# Altium footprint library WR-TBL_Pluggable PCB Header_3.50mm.PcbLib: 50 footprints (part 4 of 4)
Each footprint in its own frame and in the unit in brackets; x right, y up, seen from the top. Pads: shape width x height; smd on the part's side, far side on the other; paste and mask are expansions set on the pad; w line width, h text height; cw(c..) or ccw(c..) is an arc to the next point about the centre after c.
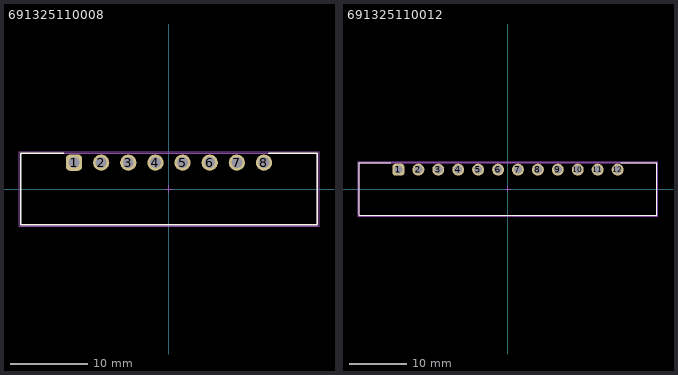
[diagram p3: the footprints below, top view; thin cyan lines are the x and y axes]

## 691325110008 [mm] "Horizontal PCB Header with Flanges, pitch 3.5mm, 08p"
height 7.2
pads (8):
  rrect50% 2.1x2.1 hole 1.4: 1(-12.25,3.4)
  round 2.1 hole 1.4: 2(-8.75,3.4) 3(-5.25,3.4) 4(-1.75,3.4) 5(1.75,3.4) 6(5.25,3.4) 7(8.75,3.4) 8(12.25,3.4)
Top Overlay:
  lines w0.2: -13.6,4.6 -19.15,4.6 -19.15,-4.6 19.15,-4.6 19.15,4.6 12.85,4.6
Top Designator:
  text ".Designator" at -7.498,-0.5 h1.5
Top Component Outline:
  lines w0.1: -19.15,-4.6 19.15,-4.6 19.15,4.6 -19.15,4.6 -19.15,-4.6
Top 3D Body:
  lines w0.1: -19.15,-4.6 -19.15,4.6 19.15,4.6 19.15,-4.6 -19.15,-4.6
Top Courtyard:
  lines w0.05: -19.35,-4.8 -19.35,4.8 19.35,4.8 19.35,-4.8 -19.35,-4.8
Top Component Center:
  lines w0.05: -0.5,0 0.5,0 ; 0,-0.5 0,0.5
3D body "691325110008.stp": height 7.3, standoff -3.4, extent -19.15,-4.6 19.15,4.6

## 691325110012 [mm] "Horizontal PCB Header with Flanges, pitch 3.5mm, 12p"
height 7.2
pads (12):
  rrect50% 2.1x2.1 hole 1.4: 1(-19.25,3.4)
  round 2.1 hole 1.4: 2(-15.75,3.4) 3(-12.25,3.4) 4(-8.75,3.4) 5(-5.25,3.4) 6(-1.75,3.4) 7(1.75,3.4) 8(5.25,3.4) 9(8.75,3.4) 10(12.25,3.4) 11(15.75,3.4) 12(19.25,3.4)
Top Overlay:
  lines w0.2: -20.6,4.6 -26.15,4.6 -26.15,-4.6 26.15,-4.6 26.15,4.6 19.85,4.6
Top Designator:
  text ".Designator" at -7.498,-0.5 h1.5
Top Component Outline:
  lines w0.1: -26.15,-4.6 26.15,-4.6 26.15,4.6 -26.15,4.6 -26.15,-4.6
Top 3D Body:
  lines w0.1: -26.15,-4.6 -26.15,4.6 26.15,4.6 26.15,-4.6 -26.15,-4.6
Top Courtyard:
  lines w0.05: -26.35,-4.8 -26.35,4.8 26.35,4.8 26.35,-4.8 -26.35,-4.8
Top Component Center:
  lines w0.05: -0.5,0 0.5,0 ; 0,-0.5 0,0.5
3D body "691325110012.stp": height 7.3, standoff -3.4, extent -26.15,-4.6 26.15,4.6